# Altium schematic symbol library jlcpcb_2025_04_capacitors_extended_1206.schlib: 2503 symbols (part 11 of 14) (continued)
## GRM31CB31E106KA75L
designator C?  Capacitance: 10uF  (hidden comment: *)
Capacitor, Ceramic (MLCC), 10uF, ±10%, 25V, B, ±10%, SMD 1206; Manufacturer: Murata Electronics; Manufacturer Part Number: GRM31CB31E106KA75L; Package Size: 1206; JLCPCB Basic Part: No; JLCPCB Part Number: C86049; Supplier 1: LCSC; Category: Capacitors - MLCC; Supplier Part Number 1: C86049; Tolerance: ±10%; Voltage Rating: 25V; Temperature Coefficient: B; RoHS: Yes; ComponentLink1Description: Datasheet; ComponentLink1URL: https://wmsc.lcsc.com/wmsc/upload/file/pdf/v2/lcsc/2304140030_Murata-Electronics-GRM31CB31E106KA75L_C86049.pdf; ComponentLink2Description: JLCPCB Part URL; ComponentLink2URL: https://jlcpcb.com/partdetail/C86049; ComponentLink3Description: LCSC Part URL; ComponentLink3URL: https://lcsc.com/product-detail/Multilayer-Ceramic-Capacitors-MLCC---SMD-SMT_Murata-Electronics-Murata-Electronics-GRM31CB31E106KA75L_C86049.html
footprint CAP-1206 (1206 (3216M) Capacitor)
pins: 1, 2

## GRM31CB31H106KA12L
designator C?  Capacitance: 10uF  (hidden comment: *)
Capacitor, Ceramic (MLCC), 10uF, ±10%, 50V, B, ±10%, SMD 1206; Manufacturer: Murata Electronics; Manufacturer Part Number: GRM31CB31H106KA12L; Package Size: 1206; JLCPCB Basic Part: No; JLCPCB Part Number: C521234; Supplier 1: LCSC; Category: Capacitors - MLCC; Supplier Part Number 1: C521234; Tolerance: ±10%; Voltage Rating: 50V; Temperature Coefficient: B; RoHS: Yes; ComponentLink1Description: Datasheet; ComponentLink1URL: https://wmsc.lcsc.com/wmsc/upload/file/pdf/v2/lcsc/2005071602_Murata-Electronics-GRM31CB31H106KA12L_C521234.pdf; ComponentLink2Description: JLCPCB Part URL; ComponentLink2URL: https://jlcpcb.com/partdetail/C521234; ComponentLink3Description: LCSC Part URL; ComponentLink3URL: https://lcsc.com/product-detail/Multilayer-Ceramic-Capacitors-MLCC---SMD-SMT_Murata-Electronics-Murata-Electronics-GRM31CB31H106KA12L_C521234.html
footprint CAP-1206 (1206 (3216M) Capacitor)
pins: 1, 2

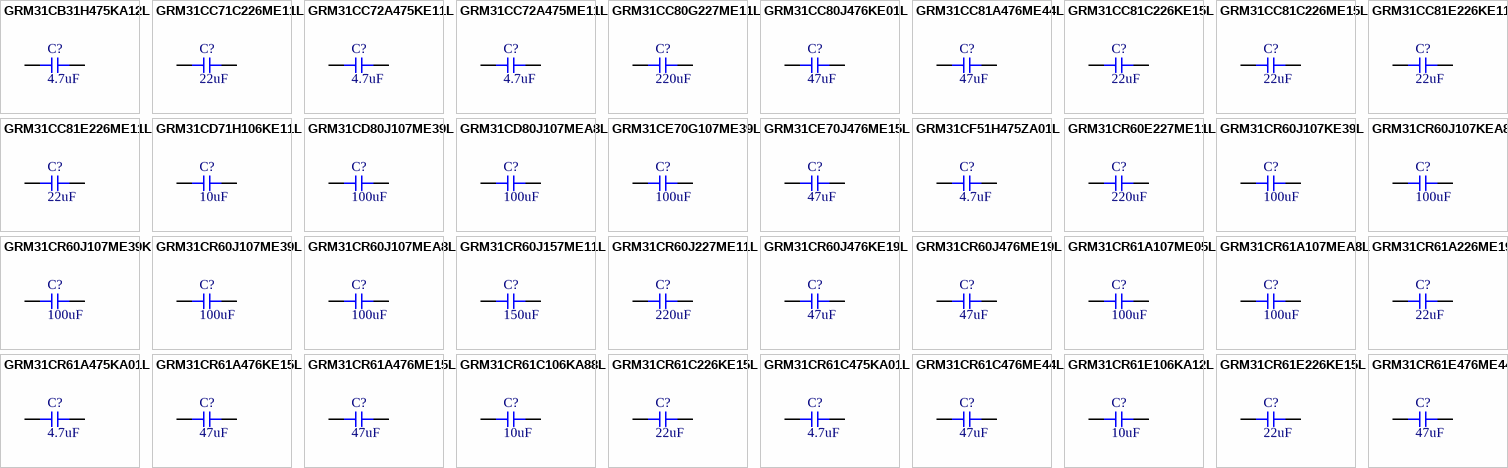
[diagram p48: symbols GRM31CB31H475KA12L to GRM31CR61E476ME44L]

## GRM31CB31H475KA12L
designator C?  Capacitance: 4.7uF  (hidden comment: *)
Capacitor, Ceramic (MLCC), 4.7uF, ±10%, 50V, B, ±10%, SMD 1206; Manufacturer: Murata Electronics; Manufacturer Part Number: GRM31CB31H475KA12L; Package Size: 1206; JLCPCB Basic Part: No; JLCPCB Part Number: C397306; Supplier 1: LCSC; Category: Capacitors - MLCC; Supplier Part Number 1: C397306; Tolerance: ±10%; Voltage Rating: 50V; Temperature Coefficient: B; RoHS: Yes; ComponentLink1Description: Datasheet; ComponentLink1URL: https://wmsc.lcsc.com/wmsc/upload/file/pdf/v2/lcsc/1912111437_Murata-Electronics-GRM31CB31H475KA12L_C397306.pdf; ComponentLink2Description: JLCPCB Part URL; ComponentLink2URL: https://jlcpcb.com/partdetail/C397306; ComponentLink3Description: LCSC Part URL; ComponentLink3URL: https://lcsc.com/product-detail/Multilayer-Ceramic-Capacitors-MLCC---SMD-SMT_Murata-Electronics-Murata-Electronics-GRM31CB31H475KA12L_C397306.html
footprint CAP-1206 (1206 (3216M) Capacitor)
pins: 1, 2

## GRM31CC71C226ME11L
designator C?  Capacitance: 22uF  (hidden comment: *)
Capacitor, Ceramic (MLCC), 22uF, ±20%, 16V, X7S, ±20%, SMD 1206; Manufacturer: Murata Electronics; Manufacturer Part Number: GRM31CC71C226ME11L; Package Size: 1206; JLCPCB Basic Part: No; JLCPCB Part Number: C385044; Supplier 1: LCSC; Category: Capacitors - MLCC; Supplier Part Number 1: C385044; Tolerance: ±20%; Voltage Rating: 16V; Temperature Coefficient: X7S; RoHS: Yes; ComponentLink1Description: Datasheet; ComponentLink1URL: https://wmsc.lcsc.com/wmsc/upload/file/pdf/v2/lcsc/1912111437_Murata-Electronics-GRM31CC71C226ME11L_C385044.pdf; ComponentLink2Description: JLCPCB Part URL; ComponentLink2URL: https://jlcpcb.com/partdetail/C385044; ComponentLink3Description: LCSC Part URL; ComponentLink3URL: https://lcsc.com/product-detail/Multilayer-Ceramic-Capacitors-MLCC---SMD-SMT_Murata-Electronics-Murata-Electronics-GRM31CC71C226ME11L_C385044.html
footprint CAP-1206 (1206 (3216M) Capacitor)
pins: 1, 2

## GRM31CC72A475KE11L
designator C?  Capacitance: 4.7uF  (hidden comment: *)
Capacitor, Ceramic (MLCC), 4.7uF, ±10%, 100V, X7S, ±10%, SMD 1206; Manufacturer: Murata Electronics; Manufacturer Part Number: GRM31CC72A475KE11L; Package Size: 1206; JLCPCB Basic Part: No; JLCPCB Part Number: C237304; Supplier 1: LCSC; Category: Capacitors - MLCC; Supplier Part Number 1: C237304; Tolerance: ±10%; Voltage Rating: 100V; Temperature Coefficient: X7S; RoHS: Yes; ComponentLink1Description: Datasheet; ComponentLink1URL: https://wmsc.lcsc.com/wmsc/upload/file/pdf/v2/lcsc/2006220932_Murata-Electronics-GRM31CC72A475KE11L_C237304.pdf; ComponentLink2Description: JLCPCB Part URL; ComponentLink2URL: https://jlcpcb.com/partdetail/C237304; ComponentLink3Description: LCSC Part URL; ComponentLink3URL: https://lcsc.com/product-detail/Multilayer-Ceramic-Capacitors-MLCC---SMD-SMT_Murata-Electronics-Murata-Electronics-GRM31CC72A475KE11L_C237304.html
footprint CAP-1206 (1206 (3216M) Capacitor)
pins: 1, 2

## GRM31CC72A475ME11L
designator C?  Capacitance: 4.7uF  (hidden comment: *)
Capacitor, Ceramic (MLCC), 4.7uF, ±20%, 100V, X7S, ±20%, SMD 1206; Manufacturer: Murata Electronics; Manufacturer Part Number: GRM31CC72A475ME11L; Package Size: 1206; JLCPCB Basic Part: No; JLCPCB Part Number: C2182053; Supplier 1: LCSC; Category: Capacitors - MLCC; Supplier Part Number 1: C2182053; Tolerance: ±20%; Voltage Rating: 100V; Temperature Coefficient: X7S; RoHS: Yes; ComponentLink1Description: Datasheet; ComponentLink1URL: https://wmsc.lcsc.com/wmsc/upload/file/pdf/v2/lcsc/2202041230_Murata-Electronics-GRM31CC72A475ME11L_C2182053.pdf; ComponentLink2Description: JLCPCB Part URL; ComponentLink2URL: https://jlcpcb.com/partdetail/C2182053; ComponentLink3Description: LCSC Part URL; ComponentLink3URL: https://lcsc.com/product-detail/Multilayer-Ceramic-Capacitors-MLCC---SMD-SMT_Murata-Electronics-Murata-Electronics-GRM31CC72A475ME11L_C2182053.html
footprint CAP-1206 (1206 (3216M) Capacitor)
pins: 1, 2

## GRM31CC80G227ME11L
designator C?  Capacitance: 220uF  (hidden comment: *)
Capacitor, Ceramic (MLCC), 220uF, ±20%, 4V, X6S, ±20%, SMD 1206; Manufacturer: Murata Electronics; Manufacturer Part Number: GRM31CC80G227ME11L; Package Size: 1206; JLCPCB Basic Part: No; JLCPCB Part Number: C711039; Supplier 1: LCSC; Category: Capacitors - MLCC; Supplier Part Number 1: C711039; Tolerance: ±20%; Voltage Rating: 4V; Temperature Coefficient: X6S; RoHS: Yes; ComponentLink1Description: Datasheet; ComponentLink1URL: https://wmsc.lcsc.com/wmsc/upload/file/pdf/v2/lcsc/2103031707_Murata-Electronics-GRM31CC80G227ME11L_C711039.pdf; ComponentLink2Description: JLCPCB Part URL; ComponentLink2URL: https://jlcpcb.com/partdetail/C711039; ComponentLink3Description: LCSC Part URL; ComponentLink3URL: https://lcsc.com/product-detail/Multilayer-Ceramic-Capacitors-MLCC---SMD-SMT_Murata-Electronics-Murata-Electronics-GRM31CC80G227ME11L_C711039.html
footprint CAP-1206 (1206 (3216M) Capacitor)
pins: 1, 2

## GRM31CC80J476KE01L
designator C?  Capacitance: 47uF  (hidden comment: *)
Capacitor, Ceramic (MLCC), 47uF, ±10%, ±10%, SMD 1206; Manufacturer: Murata Electronics; Manufacturer Part Number: GRM31CC80J476KE01L; Package Size: 1206; JLCPCB Basic Part: No; JLCPCB Part Number: C883601; Supplier 1: LCSC; Category: Capacitors - MLCC; Supplier Part Number 1: C883601; Tolerance: ±10%; RoHS: Yes; ComponentLink1Description: Datasheet; ComponentLink1URL: https://wmsc.lcsc.com/wmsc/upload/file/pdf/v2/lcsc/2304140030_Murata-Electronics-GRM31CC80J476KE01L_C883601.pdf; ComponentLink2Description: JLCPCB Part URL; ComponentLink2URL: https://jlcpcb.com/partdetail/C883601; ComponentLink3Description: LCSC Part URL; ComponentLink3URL: https://lcsc.com/product-detail/Multilayer-Ceramic-Capacitors-MLCC---SMD-SMT_Murata-Electronics-Murata-Electronics-GRM31CC80J476KE01L_C883601.html
footprint CAP-1206 (1206 (3216M) Capacitor)
pins: 1, 2

## GRM31CC81A476ME44L
designator C?  Capacitance: 47uF  (hidden comment: *)
Capacitor, Ceramic (MLCC), 47uF, ±20%, 10V, X6S, ±20%, SMD 1206; Manufacturer: Murata Electronics; Manufacturer Part Number: GRM31CC81A476ME44L; Package Size: 1206; JLCPCB Basic Part: No; JLCPCB Part Number: C464962; Supplier 1: LCSC; Category: Capacitors - MLCC; Supplier Part Number 1: C464962; Tolerance: ±20%; Voltage Rating: 10V; Temperature Coefficient: X6S; RoHS: Yes; ComponentLink1Description: Datasheet; ComponentLink1URL: https://wmsc.lcsc.com/wmsc/upload/file/pdf/v2/lcsc/1912111437_Murata-Electronics-GRM31CC81A476ME44L_C464962.pdf; ComponentLink2Description: JLCPCB Part URL; ComponentLink2URL: https://jlcpcb.com/partdetail/C464962; ComponentLink3Description: LCSC Part URL; ComponentLink3URL: https://lcsc.com/product-detail/Multilayer-Ceramic-Capacitors-MLCC---SMD-SMT_Murata-Electronics-Murata-Electronics-GRM31CC81A476ME44L_C464962.html
footprint CAP-1206 (1206 (3216M) Capacitor)
pins: 1, 2

## GRM31CC81C226KE15L
designator C?  Capacitance: 22uF  (hidden comment: *)
Capacitor, Ceramic (MLCC), 22uF, ±10%, ±10%, SMD 1206; Manufacturer: Murata Electronics; Manufacturer Part Number: GRM31CC81C226KE15L; Package Size: 1206; JLCPCB Basic Part: No; JLCPCB Part Number: C521070; Supplier 1: LCSC; Category: Capacitors - MLCC; Supplier Part Number 1: C521070; Tolerance: ±10%; RoHS: Yes; ComponentLink1Description: Datasheet; ComponentLink1URL: https://wmsc.lcsc.com/wmsc/upload/file/pdf/v2/lcsc/2105241240_Murata-Electronics-GRM31CC81C226KE15L_C521070.pdf; ComponentLink2Description: JLCPCB Part URL; ComponentLink2URL: https://jlcpcb.com/partdetail/C521070; ComponentLink3Description: LCSC Part URL; ComponentLink3URL: https://lcsc.com/product-detail/Multilayer-Ceramic-Capacitors-MLCC---SMD-SMT_Murata-Electronics-Murata-Electronics-GRM31CC81C226KE15L_C521070.html
footprint CAP-1206 (1206 (3216M) Capacitor)
pins: 1, 2

## GRM31CC81C226ME15L
designator C?  Capacitance: 22uF  (hidden comment: *)
Capacitor, Ceramic (MLCC), 22uF, ±20%, 16V, X6S, ±20%, SMD 1206; Manufacturer: Murata Electronics; Manufacturer Part Number: GRM31CC81C226ME15L; Package Size: 1206; JLCPCB Basic Part: No; JLCPCB Part Number: C162488; Supplier 1: LCSC; Category: Capacitors - MLCC; Supplier Part Number 1: C162488; Tolerance: ±20%; Voltage Rating: 16V; Temperature Coefficient: X6S; RoHS: Yes; ComponentLink1Description: Datasheet; ComponentLink1URL: https://wmsc.lcsc.com/wmsc/upload/file/pdf/v2/lcsc/2304140030_Murata-Electronics-GRM31CC81C226ME15L_C162488.pdf; ComponentLink2Description: JLCPCB Part URL; ComponentLink2URL: https://jlcpcb.com/partdetail/C162488; ComponentLink3Description: LCSC Part URL; ComponentLink3URL: https://lcsc.com/product-detail/Multilayer-Ceramic-Capacitors-MLCC---SMD-SMT_Murata-Electronics-Murata-Electronics-GRM31CC81C226ME15L_C162488.html
footprint CAP-1206 (1206 (3216M) Capacitor)
pins: 1, 2

## GRM31CC81E226KE11L
designator C?  Capacitance: 22uF  (hidden comment: *)
Capacitor, Ceramic (MLCC), 22uF, ±10%, 25V, X6S, ±10%, SMD 1206; Manufacturer: Murata Electronics; Manufacturer Part Number: GRM31CC81E226KE11L; Package Size: 1206; JLCPCB Basic Part: No; JLCPCB Part Number: C521069; Supplier 1: LCSC; Category: Capacitors - MLCC; Supplier Part Number 1: C521069; Tolerance: ±10%; Voltage Rating: 25V; Temperature Coefficient: X6S; RoHS: Yes; ComponentLink1Description: Datasheet; ComponentLink1URL: https://wmsc.lcsc.com/wmsc/upload/file/pdf/v2/lcsc/2007231106_Murata-Electronics-GRM31CC81E226KE11L_C521069.pdf; ComponentLink2Description: JLCPCB Part URL; ComponentLink2URL: https://jlcpcb.com/partdetail/C521069; ComponentLink3Description: LCSC Part URL; ComponentLink3URL: https://lcsc.com/product-detail/Multilayer-Ceramic-Capacitors-MLCC---SMD-SMT_Murata-Electronics-Murata-Electronics-GRM31CC81E226KE11L_C521069.html
footprint CAP-1206 (1206 (3216M) Capacitor)
pins: 1, 2

## GRM31CC81E226ME11L
designator C?  Capacitance: 22uF  (hidden comment: *)
Capacitor, Ceramic (MLCC), 22uF, ±20%, 25V, X6S, ±20%, SMD 1206; Manufacturer: Murata Electronics; Manufacturer Part Number: GRM31CC81E226ME11L; Package Size: 1206; JLCPCB Basic Part: No; JLCPCB Part Number: C415531; Supplier 1: LCSC; Category: Capacitors - MLCC; Supplier Part Number 1: C415531; Tolerance: ±20%; Voltage Rating: 25V; Temperature Coefficient: X6S; RoHS: Yes; ComponentLink1Description: Datasheet; ComponentLink1URL: https://wmsc.lcsc.com/wmsc/upload/file/pdf/v2/lcsc/2304140030_Murata-Electronics-GRM31CC81E226ME11L_C415531.pdf; ComponentLink2Description: JLCPCB Part URL; ComponentLink2URL: https://jlcpcb.com/partdetail/C415531; ComponentLink3Description: LCSC Part URL; ComponentLink3URL: https://lcsc.com/product-detail/Multilayer-Ceramic-Capacitors-MLCC---SMD-SMT_Murata-Electronics-Murata-Electronics-GRM31CC81E226ME11L_C415531.html
footprint CAP-1206 (1206 (3216M) Capacitor)
pins: 1, 2

## GRM31CD71H106KE11L
designator C?  Capacitance: 10uF  (hidden comment: *)
Capacitor, Ceramic (MLCC), 10uF, ±10%, 50V, X7T, ±10%, SMD 1206; Manufacturer: Murata Electronics; Manufacturer Part Number: GRM31CD71H106KE11L; Package Size: 1206; JLCPCB Basic Part: No; JLCPCB Part Number: C2987934; Supplier 1: LCSC; Category: Capacitors - MLCC; Supplier Part Number 1: C2987934; Tolerance: ±10%; Voltage Rating: 50V; Temperature Coefficient: X7T; RoHS: Yes; ComponentLink1Description: Datasheet; ComponentLink1URL: https://wmsc.lcsc.com/wmsc/upload/file/pdf/v2/lcsc/2207111830_Murata-Electronics-GRM31CD71H106KE11L_C2987934.pdf; ComponentLink2Description: JLCPCB Part URL; ComponentLink2URL: https://jlcpcb.com/partdetail/C2987934; ComponentLink3Description: LCSC Part URL; ComponentLink3URL: https://lcsc.com/product-detail/Multilayer-Ceramic-Capacitors-MLCC---SMD-SMT_Murata-Electronics-Murata-Electronics-GRM31CD71H106KE11L_C2987934.html
footprint CAP-1206 (1206 (3216M) Capacitor)
pins: 1, 2

## GRM31CD80J107ME39L
designator C?  Capacitance: 100uF  (hidden comment: *)
Capacitor, Ceramic (MLCC), 100uF, ±20%, 6.3V, X6T, ±20%, SMD 1206; Manufacturer: Murata Electronics; Manufacturer Part Number: GRM31CD80J107ME39L; Package Size: 1206; JLCPCB Basic Part: No; JLCPCB Part Number: C385045; Supplier 1: LCSC; Category: Capacitors - MLCC; Supplier Part Number 1: C385045; Tolerance: ±20%; Voltage Rating: 6.3V; Temperature Coefficient: X6T; RoHS: Yes; ComponentLink1Description: Datasheet; ComponentLink1URL: https://wmsc.lcsc.com/wmsc/upload/file/pdf/v2/lcsc/2304140030_Murata-Electronics-GRM31CD80J107ME39L_C385045.pdf; ComponentLink2Description: JLCPCB Part URL; ComponentLink2URL: https://jlcpcb.com/partdetail/C385045; ComponentLink3Description: LCSC Part URL; ComponentLink3URL: https://lcsc.com/product-detail/Multilayer-Ceramic-Capacitors-MLCC---SMD-SMT_Murata-Electronics-Murata-Electronics-GRM31CD80J107ME39L_C385045.html
footprint CAP-1206 (1206 (3216M) Capacitor)
pins: 1, 2

## GRM31CD80J107MEA8L
designator C?  Capacitance: 100uF  (hidden comment: *)
Capacitor, Ceramic (MLCC), 100uF, ±20%, 6.3V, X6T, ±20%, SMD 1206; Manufacturer: Murata Electronics; Manufacturer Part Number: GRM31CD80J107MEA8L; Package Size: 1206; JLCPCB Basic Part: No; JLCPCB Part Number: C3900149; Supplier 1: LCSC; Category: Capacitors - MLCC; Supplier Part Number 1: C3900149; Tolerance: ±20%; Voltage Rating: 6.3V; Temperature Coefficient: X6T; RoHS: Yes; ComponentLink1Description: Datasheet; ComponentLink1URL: https://wmsc.lcsc.com/wmsc/upload/file/pdf/v2/lcsc/2401272210_Murata-Electronics-GRM31CD80J107MEA8L_C3900149.pdf; ComponentLink2Description: JLCPCB Part URL; ComponentLink2URL: https://jlcpcb.com/partdetail/C3900149; ComponentLink3Description: LCSC Part URL; ComponentLink3URL: https://lcsc.com/product-detail/Multilayer-Ceramic-Capacitors-MLCC---SMD-SMT_Murata-Electronics-Murata-Electronics-GRM31CD80J107MEA8L_C3900149.html
footprint CAP-1206 (1206 (3216M) Capacitor)
pins: 1, 2

## GRM31CE70G107ME39L
designator C?  Capacitance: 100uF  (hidden comment: *)
Capacitor, Ceramic (MLCC), 100uF, ±20%, 4V, X7U, ±20%, SMD 1206; Manufacturer: Murata Electronics; Manufacturer Part Number: GRM31CE70G107ME39L; Package Size: 1206; JLCPCB Basic Part: No; JLCPCB Part Number: C426649; Supplier 1: LCSC; Category: Capacitors - MLCC; Supplier Part Number 1: C426649; Tolerance: ±20%; Voltage Rating: 4V; Temperature Coefficient: X7U; RoHS: Yes; ComponentLink1Description: Datasheet; ComponentLink1URL: https://wmsc.lcsc.com/wmsc/upload/file/pdf/v2/lcsc/2304140030_Murata-Electronics-GRM31CE70G107ME39L_C426649.pdf; ComponentLink2Description: JLCPCB Part URL; ComponentLink2URL: https://jlcpcb.com/partdetail/C426649; ComponentLink3Description: LCSC Part URL; ComponentLink3URL: https://lcsc.com/product-detail/Multilayer-Ceramic-Capacitors-MLCC---SMD-SMT_Murata-Electronics-Murata-Electronics-GRM31CE70G107ME39L_C426649.html
footprint CAP-1206 (1206 (3216M) Capacitor)
pins: 1, 2

## GRM31CE70J476ME15L
designator C?  Capacitance: 47uF  (hidden comment: *)
Capacitor, Ceramic (MLCC), 47uF, ±20%, 6.3V, X7U, ±20%, SMD 1206; Manufacturer: Murata Electronics; Manufacturer Part Number: GRM31CE70J476ME15L; Package Size: 1206; JLCPCB Basic Part: No; JLCPCB Part Number: C385046; Supplier 1: LCSC; Category: Capacitors - MLCC; Supplier Part Number 1: C385046; Tolerance: ±20%; Voltage Rating: 6.3V; Temperature Coefficient: X7U; RoHS: Yes; ComponentLink1Description: Datasheet; ComponentLink1URL: https://wmsc.lcsc.com/wmsc/upload/file/pdf/v2/lcsc/1912111437_Murata-Electronics-GRM31CE70J476ME15L_C385046.pdf; ComponentLink2Description: JLCPCB Part URL; ComponentLink2URL: https://jlcpcb.com/partdetail/C385046; ComponentLink3Description: LCSC Part URL; ComponentLink3URL: https://lcsc.com/product-detail/Multilayer-Ceramic-Capacitors-MLCC---SMD-SMT_Murata-Electronics-Murata-Electronics-GRM31CE70J476ME15L_C385046.html
footprint CAP-1206 (1206 (3216M) Capacitor)
pins: 1, 2

## GRM31CF51H475ZA01L
designator C?  Capacitance: 4.7uF  (hidden comment: *)
Capacitor, Ceramic (MLCC), 4.7uF, 50V, Y5V, SMD 1206; Manufacturer: Murata Electronics; Manufacturer Part Number: GRM31CF51H475ZA01L; Temperature Rating: -20%~+80%; Package Size: 1206; JLCPCB Basic Part: No; JLCPCB Part Number: C363937; Supplier 1: LCSC; Category: Capacitors - MLCC; Supplier Part Number 1: C363937; Voltage Rating: 50V; Temperature Coefficient: Y5V; RoHS: Yes; ComponentLink1Description: Datasheet; ComponentLink1URL: https://wmsc.lcsc.com/wmsc/upload/file/pdf/v2/lcsc/1912111437_Murata-Electronics-GRM31CF51H475ZA01L_C363937.pdf; ComponentLink2Description: JLCPCB Part URL; ComponentLink2URL: https://jlcpcb.com/partdetail/C363937; ComponentLink3Description: LCSC Part URL; ComponentLink3URL: https://lcsc.com/product-detail/Multilayer-Ceramic-Capacitors-MLCC---SMD-SMT_Murata-Electronics-Murata-Electronics-GRM31CF51H475ZA01L_C363937.html
footprint CAP-1206 (1206 (3216M) Capacitor)
pins: 1, 2

## GRM31CR60E227ME11L
designator C?  Capacitance: 220uF  (hidden comment: *)
Capacitor, Ceramic (MLCC), 220uF, ±20%, 2.5V, X5R, ±20%, SMD 1206; Manufacturer: Murata Electronics; Manufacturer Part Number: GRM31CR60E227ME11L; Package Size: 1206; JLCPCB Basic Part: No; JLCPCB Part Number: C2168120; Supplier 1: LCSC; Category: Capacitors - MLCC; Supplier Part Number 1: C2168120; Tolerance: ±20%; Voltage Rating: 2.5V; Temperature Coefficient: X5R; RoHS: Yes; ComponentLink1Description: Datasheet; ComponentLink1URL: https://wmsc.lcsc.com/wmsc/upload/file/pdf/v2/lcsc/2202040300_Murata-Electronics-GRM31CR60E227ME11L_C2168120.pdf; ComponentLink2Description: JLCPCB Part URL; ComponentLink2URL: https://jlcpcb.com/partdetail/C2168120; ComponentLink3Description: LCSC Part URL; ComponentLink3URL: https://lcsc.com/product-detail/Multilayer-Ceramic-Capacitors-MLCC---SMD-SMT_Murata-Electronics-Murata-Electronics-GRM31CR60E227ME11L_C2168120.html
footprint CAP-1206 (1206 (3216M) Capacitor)
pins: 1, 2

## GRM31CR60J107KE39L
designator C?  Capacitance: 100uF  (hidden comment: *)
Capacitor, Ceramic (MLCC), 100uF, ±10%, 6.3V, X5R, ±10%, SMD 1206; Manufacturer: Murata Electronics; Manufacturer Part Number: GRM31CR60J107KE39L; Package Size: 1206; JLCPCB Basic Part: No; JLCPCB Part Number: C782156; Supplier 1: LCSC; Category: Capacitors - MLCC; Supplier Part Number 1: C782156; Tolerance: ±10%; Voltage Rating: 6.3V; Temperature Coefficient: X5R; RoHS: Yes; ComponentLink1Description: Datasheet; ComponentLink1URL: https://wmsc.lcsc.com/wmsc/upload/file/pdf/v2/lcsc/2009161209_Murata-Electronics-GRM31CR60J107KE39L_C782156.pdf; ComponentLink2Description: JLCPCB Part URL; ComponentLink2URL: https://jlcpcb.com/partdetail/C782156; ComponentLink3Description: LCSC Part URL; ComponentLink3URL: https://lcsc.com/product-detail/Multilayer-Ceramic-Capacitors-MLCC---SMD-SMT_Murata-Electronics-Murata-Electronics-GRM31CR60J107KE39L_C782156.html
footprint CAP-1206 (1206 (3216M) Capacitor)
pins: 1, 2

## GRM31CR60J107KEA8L
designator C?  Capacitance: 100uF  (hidden comment: *)
Capacitor, Ceramic (MLCC), 100uF, ±10%, 6.3V, X5R, ±10%, SMD 1206; Manufacturer: Murata Electronics; Manufacturer Part Number: GRM31CR60J107KEA8L; Package Size: 1206; JLCPCB Basic Part: No; JLCPCB Part Number: C3038553; Supplier 1: LCSC; Category: Capacitors - MLCC; Supplier Part Number 1: C3038553; Tolerance: ±10%; Voltage Rating: 6.3V; Temperature Coefficient: X5R; RoHS: Yes; ComponentLink1Description: Datasheet; ComponentLink1URL: https://wmsc.lcsc.com/wmsc/upload/file/pdf/v2/lcsc/2206222045_Murata-Electronics-GRM31CR60J107KEA8L_C3038553.pdf; ComponentLink2Description: JLCPCB Part URL; ComponentLink2URL: https://jlcpcb.com/partdetail/C3038553; ComponentLink3Description: LCSC Part URL; ComponentLink3URL: https://lcsc.com/product-detail/Multilayer-Ceramic-Capacitors-MLCC---SMD-SMT_Murata-Electronics-Murata-Electronics-GRM31CR60J107KEA8L_C3038553.html
footprint CAP-1206 (1206 (3216M) Capacitor)
pins: 1, 2

## GRM31CR60J107ME39K
designator C?  Capacitance: 100uF  (hidden comment: *)
Capacitor, Ceramic (MLCC), 100uF, ±20%, 6.3V, ±20%, SMD 1206; Manufacturer: Murata Electronics; Manufacturer Part Number: GRM31CR60J107ME39K; Package Size: 1206; JLCPCB Basic Part: No; JLCPCB Part Number: C2167747; Supplier 1: LCSC; Category: Capacitors - MLCC; Supplier Part Number 1: C2167747; Tolerance: ±20%; Voltage Rating: 6.3V; RoHS: Yes; ComponentLink1Description: Datasheet; ComponentLink2Description: JLCPCB Part URL; ComponentLink2URL: https://jlcpcb.com/partdetail/C2167747; ComponentLink3Description: LCSC Part URL; ComponentLink3URL: https://lcsc.com/product-detail/Multilayer-Ceramic-Capacitors-MLCC---SMD-SMT_Murata-Electronics-Murata-Electronics-GRM31CR60J107ME39K_C2167747.html
footprint CAP-1206 (1206 (3216M) Capacitor)
pins: 1, 2

## GRM31CR60J107ME39L
designator C?  Capacitance: 100uF  (hidden comment: *)
Capacitor, Ceramic (MLCC), 100uF, ±20%, 6.3V, X5R, ±20%, SMD 1206; Manufacturer: Murata Electronics; Manufacturer Part Number: GRM31CR60J107ME39L; Package Size: 1206; JLCPCB Basic Part: No; JLCPCB Part Number: C77085; Supplier 1: LCSC; Category: Capacitors - MLCC; Supplier Part Number 1: C77085; Tolerance: ±20%; Voltage Rating: 6.3V; Temperature Coefficient: X5R; RoHS: Yes; ComponentLink1Description: Datasheet; ComponentLink1URL: https://wmsc.lcsc.com/wmsc/upload/file/pdf/v2/lcsc/1810201321_Murata-Electronics-GRM31CR60J107ME39L_C77085.pdf; ComponentLink2Description: JLCPCB Part URL; ComponentLink2URL: https://jlcpcb.com/partdetail/C77085; ComponentLink3Description: LCSC Part URL; ComponentLink3URL: https://lcsc.com/product-detail/Multilayer-Ceramic-Capacitors-MLCC---SMD-SMT_Murata-Electronics-Murata-Electronics-GRM31CR60J107ME39L_C77085.html
footprint CAP-1206 (1206 (3216M) Capacitor)
pins: 1, 2

## GRM31CR60J107MEA8L
designator C?  Capacitance: 100uF  (hidden comment: *)
Capacitor, Ceramic (MLCC), 100uF, ±20%, 6.3V, X5R, ±20%, SMD 1206; Manufacturer: Murata Electronics; Manufacturer Part Number: GRM31CR60J107MEA8L; Package Size: 1206; JLCPCB Basic Part: No; JLCPCB Part Number: C3849660; Supplier 1: LCSC; Category: Capacitors - MLCC; Supplier Part Number 1: C3849660; Tolerance: ±20%; Voltage Rating: 6.3V; Temperature Coefficient: X5R; RoHS: Yes; ComponentLink1Description: Datasheet; ComponentLink1URL: https://wmsc.lcsc.com/wmsc/upload/file/pdf/v2/lcsc/2308111601_Murata-Electronics-GRM31CR60J107MEA8L_C3849660.pdf; ComponentLink2Description: JLCPCB Part URL; ComponentLink2URL: https://jlcpcb.com/partdetail/C3849660; ComponentLink3Description: LCSC Part URL; ComponentLink3URL: https://lcsc.com/product-detail/Multilayer-Ceramic-Capacitors-MLCC---SMD-SMT_Murata-Electronics-Murata-Electronics-GRM31CR60J107MEA8L_C3849660.html
footprint CAP-1206 (1206 (3216M) Capacitor)
pins: 1, 2

## GRM31CR60J157ME11L
designator C?  Capacitance: 150uF  (hidden comment: *)
Capacitor, Ceramic (MLCC), 150uF, ±20%, 6.3V, X5R, ±20%, SMD 1206; Manufacturer: Murata Electronics; Manufacturer Part Number: GRM31CR60J157ME11L; Package Size: 1206; JLCPCB Basic Part: No; JLCPCB Part Number: C528968; Supplier 1: LCSC; Category: Capacitors - MLCC; Supplier Part Number 1: C528968; Tolerance: ±20%; Voltage Rating: 6.3V; Temperature Coefficient: X5R; RoHS: Yes; ComponentLink1Description: Datasheet; ComponentLink1URL: https://wmsc.lcsc.com/wmsc/upload/file/pdf/v2/lcsc/2304140030_Murata-Electronics-GRM31CR60J157ME11L_C528968.pdf; ComponentLink2Description: JLCPCB Part URL; ComponentLink2URL: https://jlcpcb.com/partdetail/C528968; ComponentLink3Description: LCSC Part URL; ComponentLink3URL: https://lcsc.com/product-detail/Multilayer-Ceramic-Capacitors-MLCC---SMD-SMT_Murata-Electronics-Murata-Electronics-GRM31CR60J157ME11L_C528968.html
footprint CAP-1206 (1206 (3216M) Capacitor)
pins: 1, 2

## GRM31CR60J227ME11L
designator C?  Capacitance: 220uF  (hidden comment: *)
Capacitor, Ceramic (MLCC), 220uF, ±20%, 6.3V, X5R, ±20%, SMD 1206; Manufacturer: Murata Electronics; Manufacturer Part Number: GRM31CR60J227ME11L; Package Size: 1206; JLCPCB Basic Part: No; JLCPCB Part Number: C412252; Supplier 1: LCSC; Category: Capacitors - MLCC; Supplier Part Number 1: C412252; Tolerance: ±20%; Voltage Rating: 6.3V; Temperature Coefficient: X5R; RoHS: Yes; ComponentLink1Description: Datasheet; ComponentLink1URL: https://wmsc.lcsc.com/wmsc/upload/file/pdf/v2/lcsc/2304140030_Murata-Electronics-GRM31CR60J227ME11L_C412252.pdf; ComponentLink2Description: JLCPCB Part URL; ComponentLink2URL: https://jlcpcb.com/partdetail/C412252; ComponentLink3Description: LCSC Part URL; ComponentLink3URL: https://lcsc.com/product-detail/Multilayer-Ceramic-Capacitors-MLCC---SMD-SMT_Murata-Electronics-Murata-Electronics-GRM31CR60J227ME11L_C412252.html
footprint CAP-1206 (1206 (3216M) Capacitor)
pins: 1, 2

## GRM31CR60J476KE19L
designator C?  Capacitance: 47uF  (hidden comment: *)
Capacitor, Ceramic (MLCC), 47uF, ±10%, 6.3V, X5R, ±10%, SMD 1206; Manufacturer: Murata Electronics; Manufacturer Part Number: GRM31CR60J476KE19L; Package Size: 1206; JLCPCB Basic Part: No; JLCPCB Part Number: C97948; Supplier 1: LCSC; Category: Capacitors - MLCC; Supplier Part Number 1: C97948; Tolerance: ±10%; Voltage Rating: 6.3V; Temperature Coefficient: X5R; RoHS: Yes; ComponentLink1Description: Datasheet; ComponentLink1URL: https://wmsc.lcsc.com/wmsc/upload/file/pdf/v2/lcsc/1810201313_Murata-Electronics-GRM31CR60J476KE19L_C97948.pdf; ComponentLink2Description: JLCPCB Part URL; ComponentLink2URL: https://jlcpcb.com/partdetail/C97948; ComponentLink3Description: LCSC Part URL; ComponentLink3URL: https://lcsc.com/product-detail/Multilayer-Ceramic-Capacitors-MLCC---SMD-SMT_Murata-Electronics-Murata-Electronics-GRM31CR60J476KE19L_C97948.html
footprint CAP-1206 (1206 (3216M) Capacitor)
pins: 1, 2

## GRM31CR60J476ME19L
designator C?  Capacitance: 47uF  (hidden comment: *)
Capacitor, Ceramic (MLCC), 47uF, ±20%, 6.3V, X5R, ±20%, SMD 1206; Manufacturer: Murata Electronics; Manufacturer Part Number: GRM31CR60J476ME19L; Package Size: 1206; JLCPCB Basic Part: No; JLCPCB Part Number: C77087; Supplier 1: LCSC; Category: Capacitors - MLCC; Supplier Part Number 1: C77087; Tolerance: ±20%; Voltage Rating: 6.3V; Temperature Coefficient: X5R; RoHS: Yes; ComponentLink1Description: Datasheet; ComponentLink1URL: https://wmsc.lcsc.com/wmsc/upload/file/pdf/v2/lcsc/2304140030_Murata-Electronics-GRM31CR60J476ME19L_C77087.pdf; ComponentLink2Description: JLCPCB Part URL; ComponentLink2URL: https://jlcpcb.com/partdetail/C77087; ComponentLink3Description: LCSC Part URL; ComponentLink3URL: https://lcsc.com/product-detail/Multilayer-Ceramic-Capacitors-MLCC---SMD-SMT_Murata-Electronics-Murata-Electronics-GRM31CR60J476ME19L_C77087.html
footprint CAP-1206 (1206 (3216M) Capacitor)
pins: 1, 2

## GRM31CR61A107ME05L
designator C?  Capacitance: 100uF  (hidden comment: *)
Capacitor, Ceramic (MLCC), 100uF, ±20%, 10V, X5R, ±20%, SMD 1206; Manufacturer: Murata Electronics; Manufacturer Part Number: GRM31CR61A107ME05L; Package Size: 1206; JLCPCB Basic Part: No; JLCPCB Part Number: C312983; Supplier 1: LCSC; Category: Capacitors - MLCC; Supplier Part Number 1: C312983; Tolerance: ±20%; Voltage Rating: 10V; Temperature Coefficient: X5R; RoHS: Yes; ComponentLink1Description: Datasheet; ComponentLink1URL: https://wmsc.lcsc.com/wmsc/upload/file/pdf/v2/lcsc/1811061115_Murata-Electronics-GRM31CR61A107ME05L_C312983.pdf; ComponentLink2Description: JLCPCB Part URL; ComponentLink2URL: https://jlcpcb.com/partdetail/C312983; ComponentLink3Description: LCSC Part URL; ComponentLink3URL: https://lcsc.com/product-detail/Multilayer-Ceramic-Capacitors-MLCC---SMD-SMT_Murata-Electronics-Murata-Electronics-GRM31CR61A107ME05L_C312983.html
footprint CAP-1206 (1206 (3216M) Capacitor)
pins: 1, 2

## GRM31CR61A107MEA8L
designator C?  Capacitance: 100uF  (hidden comment: *)
Capacitor, Ceramic (MLCC), 100uF, ±20%, 10V, X5R, ±20%, SMD 1206; Manufacturer: Murata Electronics; Manufacturer Part Number: GRM31CR61A107MEA8L; Package Size: 1206; JLCPCB Basic Part: No; JLCPCB Part Number: C883598; Supplier 1: LCSC; Category: Capacitors - MLCC; Supplier Part Number 1: C883598; Tolerance: ±20%; Voltage Rating: 10V; Temperature Coefficient: X5R; RoHS: Yes; ComponentLink1Description: Datasheet; ComponentLink1URL: https://wmsc.lcsc.com/wmsc/upload/file/pdf/v2/lcsc/2203190030_Murata-Electronics-GRM31CR61A107MEA8L_C883598.pdf; ComponentLink2Description: JLCPCB Part URL; ComponentLink2URL: https://jlcpcb.com/partdetail/C883598; ComponentLink3Description: LCSC Part URL; ComponentLink3URL: https://lcsc.com/product-detail/Multilayer-Ceramic-Capacitors-MLCC---SMD-SMT_Murata-Electronics-Murata-Electronics-GRM31CR61A107MEA8L_C883598.html
footprint CAP-1206 (1206 (3216M) Capacitor)
pins: 1, 2

## GRM31CR61A226ME19L
designator C?  Capacitance: 22uF  (hidden comment: *)
Capacitor, Ceramic (MLCC), 22uF, ±20%, 10V, X5R, ±20%, SMD 1206; Manufacturer: Murata Electronics; Manufacturer Part Number: GRM31CR61A226ME19L; Package Size: 1206; JLCPCB Basic Part: No; JLCPCB Part Number: C97951; Supplier 1: LCSC; Category: Capacitors - MLCC; Supplier Part Number 1: C97951; Tolerance: ±20%; Voltage Rating: 10V; Temperature Coefficient: X5R; RoHS: Yes; ComponentLink1Description: Datasheet; ComponentLink1URL: https://wmsc.lcsc.com/wmsc/upload/file/pdf/v2/lcsc/1810201314_Murata-Electronics-GRM31CR61A226ME19L_C97951.pdf; ComponentLink2Description: JLCPCB Part URL; ComponentLink2URL: https://jlcpcb.com/partdetail/C97951; ComponentLink3Description: LCSC Part URL; ComponentLink3URL: https://lcsc.com/product-detail/Multilayer-Ceramic-Capacitors-MLCC---SMD-SMT_Murata-Electronics-Murata-Electronics-GRM31CR61A226ME19L_C97951.html
footprint CAP-1206 (1206 (3216M) Capacitor)
pins: 1, 2

## GRM31CR61A475KA01L
designator C?  Capacitance: 4.7uF  (hidden comment: *)
Capacitor, Ceramic (MLCC), 4.7uF, ±10%, 10V, X5R, ±10%, SMD 1206; Manufacturer: Murata Electronics; Manufacturer Part Number: GRM31CR61A475KA01L; Package Size: 1206; JLCPCB Basic Part: No; JLCPCB Part Number: C527983; Supplier 1: LCSC; Category: Capacitors - MLCC; Supplier Part Number 1: C527983; Tolerance: ±10%; Voltage Rating: 10V; Temperature Coefficient: X5R; RoHS: Yes; ComponentLink1Description: Datasheet; ComponentLink1URL: https://wmsc.lcsc.com/wmsc/upload/file/pdf/v2/lcsc/2304140030_Murata-Electronics-GRM31CR61A475KA01L_C527983.pdf; ComponentLink2Description: JLCPCB Part URL; ComponentLink2URL: https://jlcpcb.com/partdetail/C527983; ComponentLink3Description: LCSC Part URL; ComponentLink3URL: https://lcsc.com/product-detail/Multilayer-Ceramic-Capacitors-MLCC---SMD-SMT_Murata-Electronics-Murata-Electronics-GRM31CR61A475KA01L_C527983.html
footprint CAP-1206 (1206 (3216M) Capacitor)
pins: 1, 2

## GRM31CR61A476KE15L
designator C?  Capacitance: 47uF  (hidden comment: *)
Capacitor, Ceramic (MLCC), 47uF, ±10%, 10V, X5R, ±10%, SMD 1206; Manufacturer: Murata Electronics; Manufacturer Part Number: GRM31CR61A476KE15L; Package Size: 1206; JLCPCB Basic Part: No; JLCPCB Part Number: C426659; Supplier 1: LCSC; Category: Capacitors - MLCC; Supplier Part Number 1: C426659; Tolerance: ±10%; Voltage Rating: 10V; Temperature Coefficient: X5R; RoHS: Yes; ComponentLink1Description: Datasheet; ComponentLink1URL: https://wmsc.lcsc.com/wmsc/upload/file/pdf/v2/lcsc/2304140030_Murata-Electronics-GRM31CR61A476KE15L_C426659.pdf; ComponentLink2Description: JLCPCB Part URL; ComponentLink2URL: https://jlcpcb.com/partdetail/C426659; ComponentLink3Description: LCSC Part URL; ComponentLink3URL: https://lcsc.com/product-detail/Multilayer-Ceramic-Capacitors-MLCC---SMD-SMT_Murata-Electronics-Murata-Electronics-GRM31CR61A476KE15L_C426659.html
footprint CAP-1206 (1206 (3216M) Capacitor)
pins: 1, 2

## GRM31CR61A476ME15L
designator C?  Capacitance: 47uF  (hidden comment: *)
Capacitor, Ceramic (MLCC), 47uF, ±20%, 10V, X5R, ±20%, SMD 1206; Manufacturer: Murata Electronics; Manufacturer Part Number: GRM31CR61A476ME15L; Package Size: 1206; JLCPCB Basic Part: No; JLCPCB Part Number: C94034; Supplier 1: LCSC; Category: Capacitors - MLCC; Supplier Part Number 1: C94034; Tolerance: ±20%; Voltage Rating: 10V; Temperature Coefficient: X5R; RoHS: Yes; ComponentLink1Description: Datasheet; ComponentLink1URL: https://wmsc.lcsc.com/wmsc/upload/file/pdf/v2/lcsc/1810201233_Murata-Electronics-GRM31CR61A476ME15L_C94034.pdf; ComponentLink2Description: JLCPCB Part URL; ComponentLink2URL: https://jlcpcb.com/partdetail/C94034; ComponentLink3Description: LCSC Part URL; ComponentLink3URL: https://lcsc.com/product-detail/Multilayer-Ceramic-Capacitors-MLCC---SMD-SMT_Murata-Electronics-Murata-Electronics-GRM31CR61A476ME15L_C94034.html
footprint CAP-1206 (1206 (3216M) Capacitor)
pins: 1, 2

## GRM31CR61C106KA88L
designator C?  Capacitance: 10uF  (hidden comment: *)
Capacitor, Ceramic (MLCC), 10uF, ±10%, ±10%, SMD 1206; Manufacturer: Murata Electronics; Manufacturer Part Number: GRM31CR61C106KA88L; Package Size: 1206; JLCPCB Basic Part: No; JLCPCB Part Number: C97952; Supplier 1: LCSC; Category: Capacitors - MLCC; Supplier Part Number 1: C97952; Tolerance: ±10%; RoHS: Yes; ComponentLink1Description: Datasheet; ComponentLink1URL: https://wmsc.lcsc.com/wmsc/upload/file/pdf/v2/lcsc/2304140030_Murata-Electronics-GRM31CR61C106KA88L_C97952.pdf; ComponentLink2Description: JLCPCB Part URL; ComponentLink2URL: https://jlcpcb.com/partdetail/C97952; ComponentLink3Description: LCSC Part URL; ComponentLink3URL: https://lcsc.com/product-detail/Multilayer-Ceramic-Capacitors-MLCC---SMD-SMT_Murata-Electronics-Murata-Electronics-GRM31CR61C106KA88L_C97952.html
footprint CAP-1206 (1206 (3216M) Capacitor)
pins: 1, 2

## GRM31CR61C226KE15L
designator C?  Capacitance: 22uF  (hidden comment: *)
Capacitor, Ceramic (MLCC), 22uF, ±10%, 16V, X5R, ±10%, SMD 1206; Manufacturer: Murata Electronics; Manufacturer Part Number: GRM31CR61C226KE15L; Package Size: 1206; JLCPCB Basic Part: No; JLCPCB Part Number: C77088; Supplier 1: LCSC; Category: Capacitors - MLCC; Supplier Part Number 1: C77088; Tolerance: ±10%; Voltage Rating: 16V; Temperature Coefficient: X5R; RoHS: Yes; ComponentLink1Description: Datasheet; ComponentLink1URL: https://wmsc.lcsc.com/wmsc/upload/file/pdf/v2/lcsc/2304140030_Murata-Electronics-GRM31CR61C226KE15L_C77088.pdf; ComponentLink2Description: JLCPCB Part URL; ComponentLink2URL: https://jlcpcb.com/partdetail/C77088; ComponentLink3Description: LCSC Part URL; ComponentLink3URL: https://lcsc.com/product-detail/Multilayer-Ceramic-Capacitors-MLCC---SMD-SMT_Murata-Electronics-Murata-Electronics-GRM31CR61C226KE15L_C77088.html
footprint CAP-1206 (1206 (3216M) Capacitor)
pins: 1, 2

## GRM31CR61C475KA01L
designator C?  Capacitance: 4.7uF  (hidden comment: *)
Capacitor, Ceramic (MLCC), 4.7uF, ±10%, 16V, X5R, ±10%, SMD 1206; Manufacturer: Murata Electronics; Manufacturer Part Number: GRM31CR61C475KA01L; Package Size: 1206; JLCPCB Basic Part: No; JLCPCB Part Number: C408151; Supplier 1: LCSC; Category: Capacitors - MLCC; Supplier Part Number 1: C408151; Tolerance: ±10%; Voltage Rating: 16V; Temperature Coefficient: X5R; RoHS: Yes; ComponentLink1Description: Datasheet; ComponentLink1URL: https://wmsc.lcsc.com/wmsc/upload/file/pdf/v2/lcsc/2304140030_Murata-Electronics-GRM31CR61C475KA01L_C408151.pdf; ComponentLink2Description: JLCPCB Part URL; ComponentLink2URL: https://jlcpcb.com/partdetail/C408151; ComponentLink3Description: LCSC Part URL; ComponentLink3URL: https://lcsc.com/product-detail/Multilayer-Ceramic-Capacitors-MLCC---SMD-SMT_Murata-Electronics-Murata-Electronics-GRM31CR61C475KA01L_C408151.html
footprint CAP-1206 (1206 (3216M) Capacitor)
pins: 1, 2

## GRM31CR61C476ME44L
designator C?  Capacitance: 47uF  (hidden comment: *)
Capacitor, Ceramic (MLCC), 47uF, ±20%, 16V, X5R, ±20%, SMD 1206; Manufacturer: Murata Electronics; Manufacturer Part Number: GRM31CR61C476ME44L; Package Size: 1206; JLCPCB Basic Part: No; JLCPCB Part Number: C385047; Supplier 1: LCSC; Category: Capacitors - MLCC; Supplier Part Number 1: C385047; Tolerance: ±20%; Voltage Rating: 16V; Temperature Coefficient: X5R; RoHS: Yes; ComponentLink1Description: Datasheet; ComponentLink1URL: https://wmsc.lcsc.com/wmsc/upload/file/pdf/v2/lcsc/2304140030_Murata-Electronics-GRM31CR61C476ME44L_C385047.pdf; ComponentLink2Description: JLCPCB Part URL; ComponentLink2URL: https://jlcpcb.com/partdetail/C385047; ComponentLink3Description: LCSC Part URL; ComponentLink3URL: https://lcsc.com/product-detail/Multilayer-Ceramic-Capacitors-MLCC---SMD-SMT_Murata-Electronics-Murata-Electronics-GRM31CR61C476ME44L_C385047.html
footprint CAP-1206 (1206 (3216M) Capacitor)
pins: 1, 2

## GRM31CR61E106KA12L
designator C?  Capacitance: 10uF  (hidden comment: *)
Capacitor, Ceramic (MLCC), 10uF, ±10%, 25V, X5R, ±10%, SMD 1206; Manufacturer: Murata Electronics; Manufacturer Part Number: GRM31CR61E106KA12L; Package Size: 1206; JLCPCB Basic Part: No; JLCPCB Part Number: C77090; Supplier 1: LCSC; Category: Capacitors - MLCC; Supplier Part Number 1: C77090; Tolerance: ±10%; Voltage Rating: 25V; Temperature Coefficient: X5R; RoHS: Yes; ComponentLink1Description: Datasheet; ComponentLink1URL: https://wmsc.lcsc.com/wmsc/upload/file/pdf/v2/lcsc/2204121115_Murata-Electronics-GRM31CR61E106KA12L_C77090.pdf; ComponentLink2Description: JLCPCB Part URL; ComponentLink2URL: https://jlcpcb.com/partdetail/C77090; ComponentLink3Description: LCSC Part URL; ComponentLink3URL: https://lcsc.com/product-detail/Multilayer-Ceramic-Capacitors-MLCC---SMD-SMT_Murata-Electronics-Murata-Electronics-GRM31CR61E106KA12L_C77090.html
footprint CAP-1206 (1206 (3216M) Capacitor)
pins: 1, 2

## GRM31CR61E226KE15L
designator C?  Capacitance: 22uF  (hidden comment: *)
Capacitor, Ceramic (MLCC), 22uF, ±10%, 25V, X5R, ±10%, SMD 1206; Manufacturer: Murata Electronics; Manufacturer Part Number: GRM31CR61E226KE15L; Package Size: 1206; JLCPCB Basic Part: No; JLCPCB Part Number: C77091; Supplier 1: LCSC; Category: Capacitors - MLCC; Supplier Part Number 1: C77091; Tolerance: ±10%; Voltage Rating: 25V; Temperature Coefficient: X5R; RoHS: Yes; ComponentLink1Description: Datasheet; ComponentLink1URL: https://wmsc.lcsc.com/wmsc/upload/file/pdf/v2/lcsc/2304140030_Murata-Electronics-GRM31CR61E226KE15L_C77091.pdf; ComponentLink2Description: JLCPCB Part URL; ComponentLink2URL: https://jlcpcb.com/partdetail/C77091; ComponentLink3Description: LCSC Part URL; ComponentLink3URL: https://lcsc.com/product-detail/Multilayer-Ceramic-Capacitors-MLCC---SMD-SMT_Murata-Electronics-Murata-Electronics-GRM31CR61E226KE15L_C77091.html
footprint CAP-1206 (1206 (3216M) Capacitor)
pins: 1, 2

## GRM31CR61E476ME44L
designator C?  Capacitance: 47uF  (hidden comment: *)
Capacitor, Ceramic (MLCC), 47uF, ±20%, 25V, X5R, ±20%, SMD 1206; Manufacturer: Murata Electronics; Manufacturer Part Number: GRM31CR61E476ME44L; Package Size: 1206; JLCPCB Basic Part: No; JLCPCB Part Number: C403725; Supplier 1: LCSC; Category: Capacitors - MLCC; Supplier Part Number 1: C403725; Tolerance: ±20%; Voltage Rating: 25V; Temperature Coefficient: X5R; RoHS: Yes; ComponentLink1Description: Datasheet; ComponentLink1URL: https://wmsc.lcsc.com/wmsc/upload/file/pdf/v2/lcsc/1912111437_Murata-Electronics-GRM31CR61E476ME44L_C403725.pdf; ComponentLink2Description: JLCPCB Part URL; ComponentLink2URL: https://jlcpcb.com/partdetail/C403725; ComponentLink3Description: LCSC Part URL; ComponentLink3URL: https://lcsc.com/product-detail/Multilayer-Ceramic-Capacitors-MLCC---SMD-SMT_Murata-Electronics-Murata-Electronics-GRM31CR61E476ME44L_C403725.html
footprint CAP-1206 (1206 (3216M) Capacitor)
pins: 1, 2

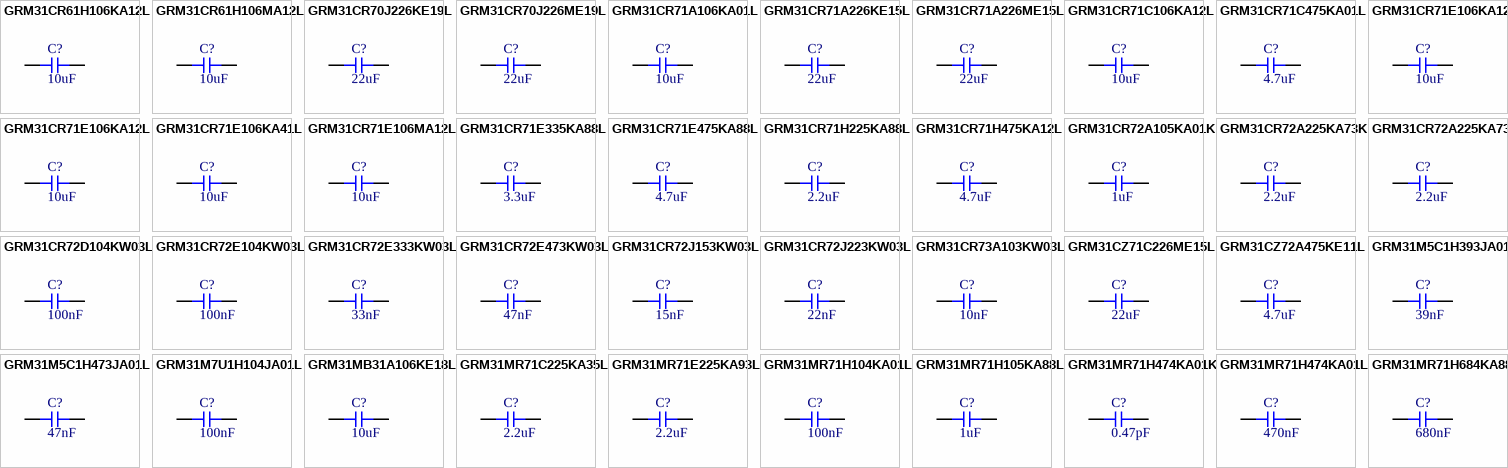
[diagram p49: symbols GRM31CR61H106KA12L to GRM31MR71H684KA88L]

## GRM31CR61H106KA12L
designator C?  Capacitance: 10uF  (hidden comment: *)
Capacitor, Ceramic (MLCC), 10uF, ±10%, 50V, X5R, ±10%, SMD 1206; Manufacturer: Murata Electronics; Manufacturer Part Number: GRM31CR61H106KA12L; Package Size: 1206; JLCPCB Basic Part: No; JLCPCB Part Number: C77092; Supplier 1: LCSC; Category: Capacitors - MLCC; Supplier Part Number 1: C77092; Tolerance: ±10%; Voltage Rating: 50V; Temperature Coefficient: X5R; RoHS: Yes; ComponentLink1Description: Datasheet; ComponentLink1URL: https://wmsc.lcsc.com/wmsc/upload/file/pdf/v2/lcsc/2304140030_Murata-Electronics-GRM31CR61H106KA12L_C77092.pdf; ComponentLink2Description: JLCPCB Part URL; ComponentLink2URL: https://jlcpcb.com/partdetail/C77092; ComponentLink3Description: LCSC Part URL; ComponentLink3URL: https://lcsc.com/product-detail/Multilayer-Ceramic-Capacitors-MLCC---SMD-SMT_Murata-Electronics-Murata-Electronics-GRM31CR61H106KA12L_C77092.html
footprint CAP-1206 (1206 (3216M) Capacitor)
pins: 1, 2

## GRM31CR61H106MA12L
designator C?  Capacitance: 10uF  (hidden comment: *)
Capacitor, Ceramic (MLCC), 10uF, ±20%, ±20%, SMD 1206; Manufacturer: Murata Electronics; Manufacturer Part Number: GRM31CR61H106MA12L; Package Size: 1206; JLCPCB Basic Part: No; JLCPCB Part Number: C882507; Supplier 1: LCSC; Category: Capacitors - MLCC; Supplier Part Number 1: C882507; Tolerance: ±20%; RoHS: Yes; ComponentLink1Description: Datasheet; ComponentLink1URL: https://wmsc.lcsc.com/wmsc/upload/file/pdf/v2/lcsc/2201242130_Murata-Electronics-GRM31CR61H106MA12L_C882507.pdf; ComponentLink2Description: JLCPCB Part URL; ComponentLink2URL: https://jlcpcb.com/partdetail/C882507; ComponentLink3Description: LCSC Part URL; ComponentLink3URL: https://lcsc.com/product-detail/Multilayer-Ceramic-Capacitors-MLCC---SMD-SMT_Murata-Electronics-Murata-Electronics-GRM31CR61H106MA12L_C882507.html
footprint CAP-1206 (1206 (3216M) Capacitor)
pins: 1, 2
